# Altium footprint library mypcblib.PcbLib: 124 footprints (part 8 of 8)
Each footprint in its own frame and in the unit in brackets; x right, y up, seen from the top. Pads: shape width x height; smd on the part's side, far side on the other; paste and mask are expansions set on the pad; w line width, h text height; cw(c..) or ccw(c..) is an arc to the next point about the centre after c.
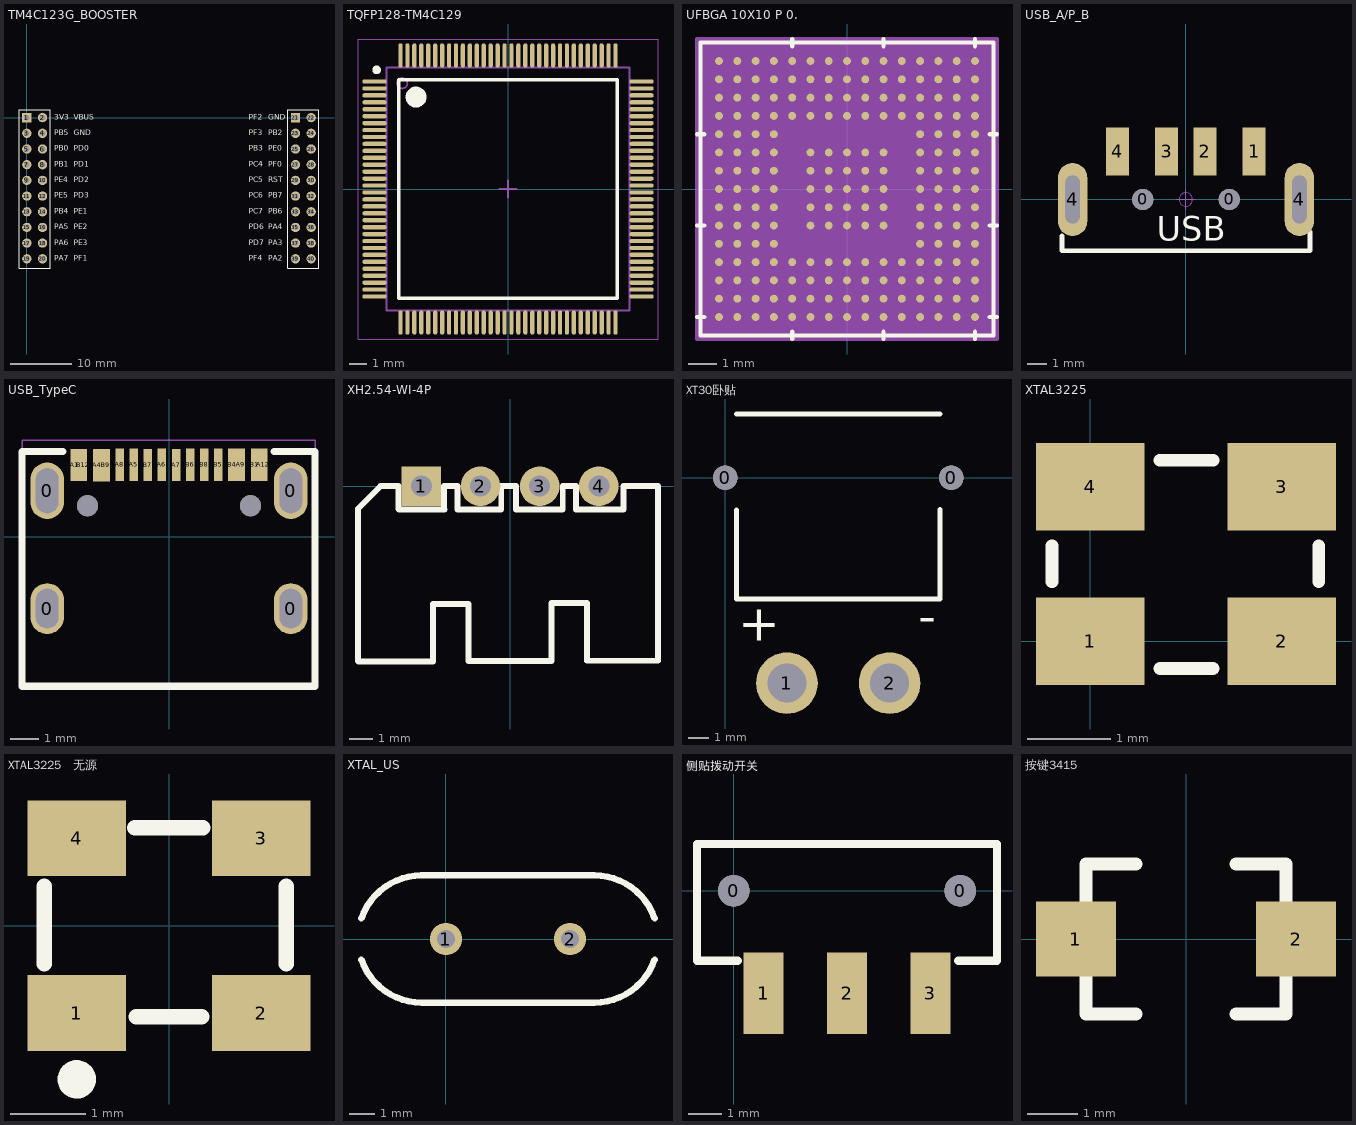
[diagram p7: the footprints below, top view; thin cyan lines are the x and y axes]

## TM4C123G_BOOSTER [mm]
pads (40):
  rect 1.5x1.5 hole 0.9: 1(0,0) 21(43.5,0)
  round 1.5 hole 0.9: 2(2.54,0) 3(0,-2.54) 4(2.54,-2.54) 5(0,-5.08) 6(2.54,-5.08) 7(0,-7.62) 8(2.54,-7.62) 9(0,-10.16) 10(2.54,-10.16) 11(0,-12.7) 12(2.54,-12.7) 13(0,-15.24) 14(2.54,-15.24) 15(0,-17.78) 16(2.54,-17.78) 17(0,-20.32) 18(2.54,-20.32) 19(0,-22.86) 20(2.54,-22.86) 22(46.04,0) 23(43.5,-2.54) 24(46.04,-2.54) 25(43.5,-5.08) 26(46.04,-5.08) 27(43.5,-7.62) 28(46.04,-7.62) 29(43.5,-10.16) 30(46.04,-10.16) 31(43.5,-12.7) 32(46.04,-12.7) 33(43.5,-15.24) 34(46.04,-15.24) 35(43.5,-17.78) 36(46.04,-17.78) 37(43.5,-20.32) 38(46.04,-20.32) 39(43.5,-22.86) 40(46.04,-22.86)
Top Overlay:
  lines w0.2: -1.27,-24.384 -1.27,1.27 3.81,1.27 3.81,-24.384 -1.27,-24.384 ; 42.23,-24.384 47.31,-24.384 47.31,1.27 42.23,1.27 42.23,-24.384
  text "3V3" at 4.445,-0.635 h1.52
  text "VBUS" at 7.62,-0.635 h1.52
  text "PB5" at 4.445,-3.175 h1.52
  text "GND" at 7.62,-3.175 h1.52
  text "PB0" at 4.445,-5.715 h1.52
  text "PB1" at 4.445,-8.255 h1.52
  text "PE4" at 4.445,-10.795 h1.52
  text "PE5" at 4.445,-13.335 h1.52
  text "PB4" at 4.445,-15.875 h1.52
  text "PA5" at 4.445,-18.415 h1.52
  text "PA6" at 4.445,-20.955 h1.52
  text "PA7" at 4.445,-23.495 h1.52
  text "PF1" at 7.62,-23.495 h1.52
  text "PE3" at 7.62,-20.955 h1.52
  text "PE2" at 7.62,-18.415 h1.52
  text "PE1" at 7.62,-15.875 h1.52
  text "PD3" at 7.62,-13.335 h1.52
  text "PD2" at 7.62,-10.795 h1.52
  text "PD1" at 7.62,-8.255 h1.52
  text "PD0" at 7.62,-5.715 h1.52
  text "GND" at 39.116,-0.635 h1.52
  text "PB2" at 39.116,-3.175 h1.52
  text "PF0" at 39.116,-8.255 h1.52
  text "RST" at 39.116,-10.795 h1.52
  text "PB7" at 39.116,-13.335 h1.52
  text "PB6" at 39.116,-15.875 h1.52
  text "PA4" at 39.116,-18.415 h1.52
  text "PA3" at 39.116,-20.955 h1.52
  text "PA2" at 39.116,-23.495 h1.52
  text "PF4" at 35.941,-23.495 h1.52
  text "PD7" at 35.941,-20.955 h1.52
  text "PD6" at 35.941,-18.415 h1.52
  text "PC7" at 35.941,-15.875 h1.52
  text "PC6" at 35.941,-13.335 h1.52
  text "PC5" at 35.941,-10.795 h1.52
  text "PC4" at 35.941,-8.255 h1.52
  text "PB3" at 35.941,-5.715 h1.52
  text "PF3" at 35.941,-3.175 h1.52
  text "PF2" at 35.941,-0.635 h1.52
  text "PE0" at 39.116,-5.715 h1.52

## TQFP128-TM4C129 [mm] "Thin QFP, 128-Leads, Body 14x14mm, Pitch 0.4mm, IPC Medium Density"
height 1.2
pads (128):
  oval 1.4x0.25 smd: 1(-7.7,6.2) 2(-7.7,5.8) 3(-7.7,5.4) 4(-7.7,5) 5(-7.7,4.6) 6(-7.7,4.2) 7(-7.7,3.8) 8(-7.7,3.4) 9(-7.7,3) 10(-7.7,2.6) 11(-7.7,2.2) 12(-7.7,1.8) 13(-7.7,1.4) 14(-7.7,1) 15(-7.7,0.6) 16(-7.7,0.2) 17(-7.7,-0.2) 18(-7.7,-0.6) 19(-7.7,-1) 20(-7.7,-1.4) 21(-7.7,-1.8) 22(-7.7,-2.2) 23(-7.7,-2.6) 24(-7.7,-3) 25(-7.7,-3.4) 26(-7.7,-3.8) 27(-7.7,-4.2) 28(-7.7,-4.6) 29(-7.7,-5) 30(-7.7,-5.4) 31(-7.7,-5.8) 32(-7.7,-6.2) 65(7.7,-6.2) 66(7.7,-5.8) 67(7.7,-5.4) 68(7.7,-5) 69(7.7,-4.6) 70(7.7,-4.2) 71(7.7,-3.8) 72(7.7,-3.4) 73(7.7,-3) 74(7.7,-2.6) 75(7.7,-2.2) 76(7.7,-1.8) 77(7.7,-1.4) 78(7.7,-1) 79(7.7,-0.6) 80(7.7,-0.2) 81(7.7,0.2) 82(7.7,0.6) 83(7.7,1) 84(7.7,1.4) 85(7.7,1.8) 86(7.7,2.2) 87(7.7,2.6) 88(7.7,3) 89(7.7,3.4) 90(7.7,3.8) 91(7.7,4.2) 92(7.7,4.6) 93(7.7,5) 94(7.7,5.4) 95(7.7,5.8) 96(7.7,6.2)
  oval 0.25x1.4 smd: 33(-6.2,-7.7) 34(-5.8,-7.7) 35(-5.4,-7.7) 36(-5,-7.7) 37(-4.6,-7.7) 38(-4.2,-7.7) 39(-3.8,-7.7) 40(-3.4,-7.7) 41(-3,-7.7) 42(-2.6,-7.7) 43(-2.2,-7.7) 44(-1.8,-7.7) 45(-1.4,-7.7) 46(-1,-7.7) 47(-0.6,-7.7) 48(-0.2,-7.7) 49(0.2,-7.7) 50(0.6,-7.7) 51(1,-7.7) 52(1.4,-7.7) 53(1.8,-7.7) 54(2.2,-7.7) 55(2.6,-7.7) 56(3,-7.7) 57(3.4,-7.7) 58(3.8,-7.7) 59(4.2,-7.7) 60(4.6,-7.7) 61(5,-7.7) 62(5.4,-7.7) 63(5.8,-7.7) 64(6.2,-7.7) 97(6.2,7.7) 98(5.8,7.7) 99(5.4,7.7) 100(5,7.7) 101(4.6,7.7) 102(4.2,7.7) 103(3.8,7.7) 104(3.4,7.7) 105(3,7.7) 106(2.6,7.7) 107(2.2,7.7) 108(1.8,7.7) 109(1.4,7.7) 110(1,7.7) 111(0.6,7.7) 112(0.2,7.7) 113(-0.2,7.7) 114(-0.6,7.7) 115(-1,7.7) 116(-1.4,7.7) 117(-1.8,7.7) 118(-2.2,7.7) 119(-2.6,7.7) 120(-3,7.7) 121(-3.4,7.7) 122(-3.8,7.7) 123(-4.2,7.7) 124(-4.6,7.7) 125(-5,7.7) 126(-5.4,7.7) 127(-5.8,7.7) 128(-6.2,7.7)
Top Overlay:
  circle w0.25: c-7.575,6.87 r0.125
  circle w0.6: c-5.3,5.3 r0.3
  lines w0.2: -6.3,-6.3 -6.3,6.3 6.3,6.3 6.3,-6.3 -6.3,-6.3
Mechanical 5:
  circle w0.1: c-6.1,6.1 r0.3
  lines w0.1: -7,-7 -7,7 7,7 7,-7 -7,-7
Mechanical 15:
  lines w0.05: -8.65,-8.65 -8.65,8.65 8.65,8.65 8.65,-8.65 -8.65,-8.65
  lines w0.1: -0.5,0 0.5,0 ; 0,-0.5 0,0.5
3D body "PDT0128A.stp": height 1.07, standoff 0, extent -8,-8 8,8

## UFBGA 10X10 P 0. [mil]
pads (201):
  round 11 smd: A1(-179.13,179.13) A2(-153.54,179.13) A3(-127.95,179.13) A4(-102.36,179.13) A5(-76.77,179.13) A6(-51.18,179.13) A7(-25.59,179.13) A8(0,179.13) A9(25.59,179.13) A10(51.18,179.13) A11(76.77,179.13) A12(102.36,179.13) A13(127.95,179.13) A14(153.54,179.13) A15(179.13,179.13) B1(-179.13,153.54) B2(-153.54,153.54) B3(-127.95,153.54) B4(-102.36,153.54) B5(-76.77,153.54) B6(-51.18,153.54) B7(-25.59,153.54) B8(0,153.54) B9(25.59,153.54) B10(51.18,153.54) B11(76.77,153.54) B12(102.36,153.54) B13(127.95,153.54) B14(153.54,153.54) B15(179.13,153.54) C1(-179.13,127.95) C2(-153.54,127.95) C3(-127.95,127.95) C4(-102.36,127.95) C5(-76.77,127.95) C6(-51.18,127.95) C7(-25.59,127.95) C8(0,127.95) C9(25.59,127.95) C10(51.18,127.95) C11(76.77,127.95) C12(102.36,127.95) C13(127.95,127.95) C14(153.54,127.95) C15(179.13,127.95) D1(-179.13,102.36) D2(-153.54,102.36) D3(-127.95,102.36) D4(-102.36,102.36) D5(-76.77,102.36) D6(-51.18,102.36) D7(-25.59,102.36) D8(0,102.36) D9(25.59,102.36) D10(51.18,102.36) D11(76.77,102.36) D12(102.36,102.36) D13(127.95,102.36) D14(153.54,102.36) D15(179.13,102.36) E1(-179.13,76.77) E2(-153.54,76.77) E3(-127.95,76.77) E4(-102.36,76.77) E12(102.36,76.77) E13(127.95,76.77) E14(153.54,76.77) E15(179.13,76.77) F1(-179.13,51.18) F2(-153.54,51.18) F3(-127.95,51.18) F4(-102.36,51.18) F6(-51.18,51.18) F7(-25.59,51.18) F8(0,51.18) F9(25.59,51.18) F10(51.18,51.18) F12(102.36,51.18) F13(127.95,51.18) F14(153.54,51.18) F15(179.13,51.18) G1(-179.13,25.59) G2(-153.54,25.59) G3(-127.95,25.59) G4(-102.36,25.59) G6(-51.18,25.59) G7(-25.59,25.59) G8(0,25.59) G9(25.59,25.59) G10(51.18,25.59) G12(102.36,25.59) G13(127.95,25.59) G14(153.54,25.59) G15(179.13,25.59) H1(-179.13,0) H2(-153.54,0) H3(-127.95,0) H4(-102.36,0) H6(-51.18,0) H7(-25.59,0) H8(0,0) H9(25.59,0) H10(51.18,0) H12(102.36,0) H13(127.95,0) H14(153.54,0) H15(179.13,0) J1(-179.13,-25.59) J2(-153.54,-25.59) J3(-127.95,-25.59) J4(-102.36,-25.59) J6(-51.18,-25.59) J7(-25.59,-25.59) J8(0,-25.59) J9(25.59,-25.59) J10(51.18,-25.59) J12(102.36,-25.59) J13(127.95,-25.59) J14(153.54,-25.59) J15(179.13,-25.59) K1(-179.13,-51.18) K2(-153.54,-51.18) K3(-127.95,-51.18) K4(-102.36,-51.18) K6(-51.18,-51.18) K7(-25.59,-51.18) K8(0,-51.18) K9(25.59,-51.18) K10(51.18,-51.18) K12(102.36,-51.18) K13(127.95,-51.18) K14(153.54,-51.18) K15(179.13,-51.18) L1(-179.13,-76.77) L2(-153.54,-76.77) L3(-127.95,-76.77) L4(-102.36,-76.77) L12(102.36,-76.77) L13(127.95,-76.77) L14(153.54,-76.77) L15(179.13,-76.77) M1(-179.13,-102.36) M2(-153.54,-102.36) M3(-127.95,-102.36) M4(-102.36,-102.36) M5(-76.77,-102.36) M6(-51.18,-102.36) M7(-25.59,-102.36) M8(0,-102.36) M9(25.59,-102.36) M10(51.18,-102.36) M11(76.77,-102.36) M12(102.36,-102.36) M13(127.95,-102.36) M14(153.54,-102.36) M15(179.13,-102.36) N1(-179.13,-127.95) N2(-153.54,-127.95) N3(-127.95,-127.95) N4(-102.36,-127.95) N5(-76.77,-127.95) N6(-51.18,-127.95) N7(-25.59,-127.95) N8(0,-127.95) N9(25.59,-127.95) N10(51.18,-127.95) N11(76.77,-127.95) N12(102.36,-127.95) N13(127.95,-127.95) N14(153.54,-127.95) N15(179.13,-127.95) P1(-179.13,-153.54) P2(-153.54,-153.54) P3(-127.95,-153.54) P4(-102.36,-153.54) P5(-76.77,-153.54) P6(-51.18,-153.54) P7(-25.59,-153.54) P8(0,-153.54) P9(25.59,-153.54) P10(51.18,-153.54) P11(76.77,-153.54) P12(102.36,-153.54) P13(127.95,-153.54) P14(153.54,-153.54) P15(179.13,-153.54) R1(-179.13,-179.13) R2(-153.54,-179.13) R3(-127.95,-179.13) R4(-102.36,-179.13) R5(-76.77,-179.13) R6(-51.18,-179.13) R7(-25.59,-179.13) R8(0,-179.13) R9(25.59,-179.13) R10(51.18,-179.13) R11(76.77,-179.13) R12(102.36,-179.13) R13(127.95,-179.13) R14(153.54,-179.13) R15(179.13,-179.13)
Top Overlay:
  lines w6: -210,-179.13 -200,-179.13 ; -210,-51.18 -200,-51.18 ; -210,76.77 -200,76.77 ; -76.77,-210 -76.77,-200 ; -76.77,200 -76.77,210 ; 51.18,-210 51.18,-200 ; 51.18,200 51.18,210 ; 179.13,-210 179.13,-200 ; 179.13,200 179.13,210 ; 200,-179.13 210,-179.13 ; 200,-51.18 210,-51.18 ; 200,76.77 210,76.77 ; -205,-205 -205,205 205,205 205,-205 -205,-205
Mechanical 15:
  region: 210,-210 -210,-210 -210,210 210,210
  lines w6: -210,-210 210,-210 210,210 -210,210 -210,-210
3D body "UFBGA 10X10 P 0..stp": height 24.1, standoff 0, extent -200,-200 200,200

## USB_A/P_B [mm] "A型USB 插头，20*13*4.5mm"
height 1.75
pads (8):
  round 1.1 hole 1.1: 0(-2.237,0) 0(2.263,0)
  rect 1.2x2.5 smd: 1(3.556,2.508) 2(1,2.508) 3(-1,2.508) 4(-3.556,2.508)
  oval 1.524x3.81 hole 0.762 slot 2.5 at 90 deg: 4(-5.887,0) 4(5.913,0)
Top Overlay:
  lines w0.254: -6.437,-1.9 -6.437,-2.667 6.463,-2.667 6.463,-1.7
  text "USB" at -1.511,-2.159 h1.27
Mechanical 15:
  circle w0.05: c0,0 r0.35
  lines w0.05: -0.5,0 0.5,0 ; 0,-0.5 0,0.5
3D body "USB A型 ?": height 3.25, standoff -2.52, extent -6.46,-17.9 6.487,2.7

## USB_TypeC [mm]
pads (22):
  oval 1.2x1.8 hole 0.8 slot 1.4 at 90 deg: 0(-4.32,-2.547) 0(4.32,-2.547)
  oval 1.2x2 hole 0.8 slot 1.6 at 90 deg: 0(-4.32,1.633) 0(4.32,1.633)
  rect 0.3x1.15 smd: A1(-3.35,2.546) A4(-2.55,2.543) A5(-1.25,2.547) A6(-0.25,2.547) A7(0.25,2.546) A8(-1.75,2.547) A9(2.55,2.547) A12(3.35,2.547) B1(3.05,2.547) B4(2.25,2.547) B5(1.75,2.547) B6(0.75,2.547) B7(-0.75,2.546) B8(1.25,2.547) B9(-2.25,2.543) B12(-3.05,2.546)
  round 0.75 hole 0.75 unplated: ""(-2.89,1.102) ""(2.89,1.102)
Top Overlay:
  lines w0.254: -3.762,3.03 -5.21,3.03 -5.21,-5.301 5.179,-5.301 5.179,3.03 3.731,3.03
Mechanical 14:
  lines w0.051: -5.207,-5.359 5.182,-5.359 5.182,3.429 -5.207,3.429 -5.207,-5.359
3D body "HRO  TYPE-C-31-M-12.step": height 3.21, standoff -1, extent -4.473,-5.098 4.467,2.802

## XH2.54-WI-4P [mm] "接插件，4P"
pads (4):
  rect 1.7x1.7 hole 0.9: 1(-3.81,0)
  round 1.7 hole 0.9: 2(-1.27,0) 3(1.27,0) 4(3.81,0)
Top Overlay:
  lines w0.254: -0.376,0 -0.376,-0.988 -0.39,-1.002 -2.256,-1.002 -2.256,0 -2.828,0 -2.828,-0.982 -2.814,-0.996 -4.77,-0.996 -4.784,-0.982 -4.784,0 -5.56,0 -6.142,-0.582 -6.526,-0.966 -6.526,-7.502 -6.5,-7.528 -3.302,-7.528 -3.302,-5.058 -1.778,-5.058 -1.778,-7.502 1.778,-7.502 1.778,-5.006 3.302,-5.006 3.302,-7.49 6.35,-7.49 6.35,0 4.916,0 ; -0.364,0 0.234,0 ; 0.248,-0.996 0.248,0 ; 0.268,-0.996 2.256,-0.996 2.262,-0.99 2.262,0 2.808,0 ; 2.822,0 2.822,-1.002 4.876,-1.002 ; 4.876,-0.976 4.876,0
3D body "XH2.54-4P_H.STEP": height 5.73, standoff -3.37, extent -6.31,-7.35 6.31,0.35

## XT30卧贴 [mm]
pads (4):
  round 1.2 hole 1.2: 0(0,0) 0(11,0)
  round 3 hole 1.9: 1(3,-10) 2(8,-10)
Top Overlay:
  lines w0.254: 0.55,-1.566 0.55,-5.9 10.45,-5.9 10.45,-1.56 ; 0.55,3.1 10.45,3.1
  text "+" at 0.635,-8.509 h3.05
  text "-" at 9.398,-8.128 h3.05

## XTAL3225 [mm]
pads (4):
  rect 1.3x1.05 smd: 1(0,0) 2(2.3,0) 3(2.3,1.85) 4(0,1.85)
Top Overlay:
  lines w0.152: -0.457,0.711 -0.457,1.143 ; 0.838,-0.33 1.473,-0.33 ; 0.838,2.17 1.473,2.17 ; 2.743,0.711 2.743,1.143

## XTAL3225   无源 [mm]
pads (4):
  rect 1.3x1 smd: 1(-1.219,-1.156) 2(1.219,-1.156) 3(1.219,1.156) 4(-1.219,1.156)
Top Overlay:
  circle w0.254: c-1.219,-2.032 r0.127
  lines w0.203: -1.651,-0.507 -1.651,0.519 ; -0.452,1.294 0.45,1.294 ; -0.432,-1.207 0.432,-1.207 ; 1.549,-0.506 1.549,0.519

## XTAL_US [mil]
pads (2):
  round 50 hole 28: 1(0,0) 2(192.13,0)
Top Overlay:
  lines w10: -130.92,-31.85 ccw(c-37.79,0) -37.79,-98.42 ; -130.92,31.85 cw(c-37.79,0) -37.79,98.43 ; -38,98.42 229.92,98.43 cw(c229.92,0) 323.05,31.85 ; -37.8,-98.43 229.92,-98.42 ccw(c229.92,0) 323.05,-31.85

## 侧贴拨动开关 [mm]
pads (5):
  round 0.95 hole 0.95: 0(0,0) 0(6.8,0)
  rect 1.2x2.45 smd: 1(0.9,-3.075) 2(3.4,-3.075) 3(5.9,-3.075)
Top Overlay:
  lines w0.254: 0.127,-2.1 -1.1,-2.1 -1.1,1.4 7.9,1.4 7.9,-2.1 6.731,-2.1

## 按键3415 [mm]
pads (2):
  rect 1.6x1.5 smd: 1(-2.2,0) 2(2.2,0)
Top Overlay:
  lines w0.254: -2,-0.75 -2,-1.5 -1,-1.5 ; -2,0.75 -2,1.5 -1,1.5 ; 1,-1.5 2,-1.5 2,-0.75 ; 1,1.5 2,1.5 2,0.75